# Altium footprint library Molex FFC - FPC Connectors (SMT).PcbLib: 638 footprints (part 12 of 40)
Each footprint in its own frame and in the unit in brackets; x right, y up, seen from the top. Pads: shape width x height; smd on the part's side, far side on the other; paste and mask are expansions set on the pad; w line width, h text height; cw(c..) or ccw(c..) is an arc to the next point about the centre after c.
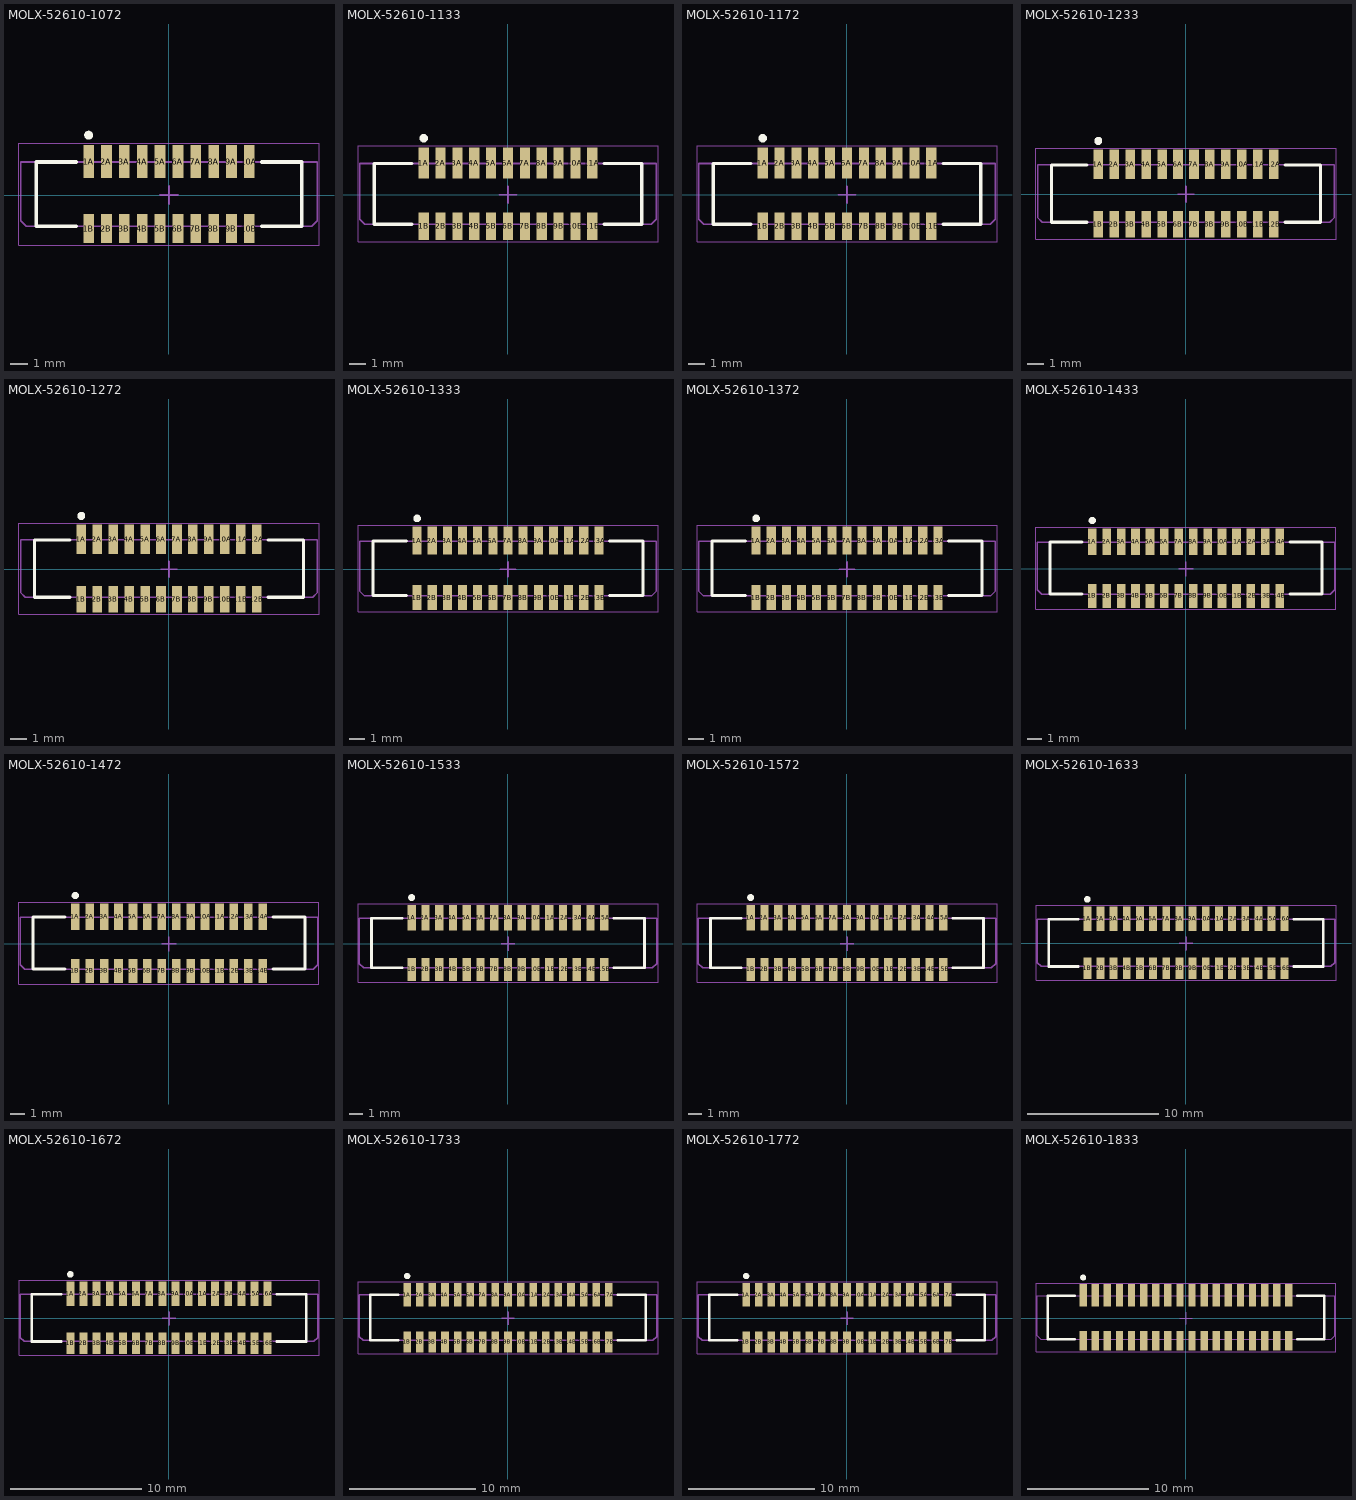
[diagram p11: the footprints below, top view; thin cyan lines are the x and y axes]

## MOLX-52610-1072 [mm] "FPC Connector, 10-Leads, Vertical, Pitch 1.0 mm, Mated Height 5.75 mm, SMT"
height 5.762
pads (20):
  rect 0.6x1.85 smd: 1A(-4.5,1.875) 2A(-3.5,1.875) 3A(-2.5,1.875) 4A(-1.5,1.875) 5A(-0.5,1.875) 6A(0.5,1.875) 7A(1.5,1.875) 8A(2.5,1.875) 9A(3.5,1.875) 10A(4.5,1.875)
  rect 0.6x1.65 smd: 1B(-4.5,-1.875) 2B(-3.5,-1.875) 3B(-2.5,-1.875) 4B(-1.5,-1.875) 5B(-0.5,-1.875) 6B(0.5,-1.875) 7B(1.5,-1.875) 8B(2.5,-1.875) 9B(3.5,-1.875) 10B(4.5,-1.875)
Top Overlay:
  circle w0.25: c-4.5,3.35 r0.125
  lines w0.2: -5.2,-1.75 -7.425,-1.75 -7.425,1.85 -5.2,1.85 ; 5.2,1.85 7.425,1.85 7.425,-1.75 5.2,-1.75
Mechanical 13:
  lines w0.1: -7.425,-1.75 -7.425,1.85 ; 7.425,-1.75 7.425,1.85 ; -8.3,-1.45 -8.3,1.85 8.3,1.85 8.3,-1.45 8,-1.75 -8,-1.75 -8.3,-1.45
Mechanical 15:
  lines w0.05: -8.4,-2.8 -8.4,2.9 8.4,2.9 8.4,-2.8 -8.4,-2.8
  lines w0.1: -0.5,0 0.5,0 ; 0,-0.5 0,0.5
3D body: height 0.25, standoff 0, extent -8.3,-2.24 8.3,2.26

## MOLX-52610-1133 [mm] "FPC Connector, 11-Leads, Vertical, Pitch 1.0 mm, Mated Height 5.75 mm, SMT"
height 5.762
pads (22):
  rect 0.6x1.85 smd: 1A(-5,1.875) 2A(-4,1.875) 3A(-3,1.875) 4A(-2,1.875) 5A(-1,1.875) 6A(0,1.875) 7A(1,1.875) 8A(2,1.875) 9A(3,1.875) 10A(4,1.875) 11A(5,1.875)
  rect 0.6x1.65 smd: 1B(-5,-1.875) 2B(-4,-1.875) 3B(-3,-1.875) 4B(-2,-1.875) 5B(-1,-1.875) 6B(0,-1.875) 7B(1,-1.875) 8B(2,-1.875) 9B(3,-1.875) 10B(4,-1.875) 11B(5,-1.875)
Top Overlay:
  circle w0.25: c-5,3.35 r0.125
  lines w0.2: -5.7,-1.75 -7.925,-1.75 -7.925,1.85 -5.7,1.85 ; 5.7,-1.75 7.925,-1.75 7.925,1.85 5.7,1.85
Mechanical 13:
  lines w0.1: -7.925,-1.75 -7.925,1.85 ; 7.925,-1.75 7.925,1.85 ; -8.8,-1.45 -8.5,-1.75 8.5,-1.75 8.8,-1.45 8.8,1.85 -8.8,1.85 -8.8,-1.45
Mechanical 15:
  lines w0.05: -8.9,-2.8 8.9,-2.8 8.9,2.9 -8.9,2.9 -8.9,-2.8
  lines w0.1: -0.5,0 0.5,0 ; 0,-0.5 0,0.5
3D body: height 0.25, standoff 0, extent -8.8,-2.24 8.8,2.26

## MOLX-52610-1172 [mm] "FPC Connector, 11-Leads, Vertical, Pitch 1.0 mm, Mated Height 5.75 mm, SMT"
height 5.762
pads (22):
  rect 0.6x1.85 smd: 1A(-5,1.875) 2A(-4,1.875) 3A(-3,1.875) 4A(-2,1.875) 5A(-1,1.875) 6A(0,1.875) 7A(1,1.875) 8A(2,1.875) 9A(3,1.875) 10A(4,1.875) 11A(5,1.875)
  rect 0.6x1.65 smd: 1B(-5,-1.875) 2B(-4,-1.875) 3B(-3,-1.875) 4B(-2,-1.875) 5B(-1,-1.875) 6B(0,-1.875) 7B(1,-1.875) 8B(2,-1.875) 9B(3,-1.875) 10B(4,-1.875) 11B(5,-1.875)
Top Overlay:
  circle w0.25: c-5,3.35 r0.125
  lines w0.2: -5.7,-1.75 -7.925,-1.75 -7.925,1.85 -5.7,1.85 ; 5.7,-1.75 7.925,-1.75 7.925,1.85 5.7,1.85
Mechanical 13:
  lines w0.1: -7.925,-1.75 -7.925,1.85 ; 7.925,-1.75 7.925,1.85 ; -8.8,-1.45 -8.5,-1.75 8.5,-1.75 8.8,-1.45 8.8,1.85 -8.8,1.85 -8.8,-1.45
Mechanical 15:
  lines w0.05: -8.9,-2.8 8.9,-2.8 8.9,2.9 -8.9,2.9 -8.9,-2.8
  lines w0.1: -0.5,0 0.5,0 ; 0,-0.5 0,0.5
3D body: height 0.25, standoff 0, extent -8.8,-2.24 8.8,2.26

## MOLX-52610-1233 [mm] "FPC Connector, 12-Leads, Vertical, Pitch 1.0 mm, Mated Height 5.75 mm, SMT"
height 5.762
pads (24):
  rect 0.6x1.85 smd: 1A(-5.5,1.875) 2A(-4.5,1.875) 3A(-3.5,1.875) 4A(-2.5,1.875) 5A(-1.5,1.875) 6A(-0.5,1.875) 7A(0.5,1.875) 8A(1.5,1.875) 9A(2.5,1.875) 10A(3.5,1.875) 11A(4.5,1.875) 12A(5.5,1.875)
  rect 0.6x1.65 smd: 1B(-5.5,-1.875) 2B(-4.5,-1.875) 3B(-3.5,-1.875) 4B(-2.5,-1.875) 5B(-1.5,-1.875) 6B(-0.5,-1.875) 7B(0.5,-1.875) 8B(1.5,-1.875) 9B(2.5,-1.875) 10B(3.5,-1.875) 11B(4.5,-1.875) 12B(5.5,-1.875)
Top Overlay:
  circle w0.25: c-5.5,3.35 r0.125
  lines w0.2: -6.2,-1.75 -8.425,-1.75 -8.425,1.85 -6.2,1.85 ; 6.2,-1.75 8.425,-1.75 8.425,1.85 6.2,1.85
Mechanical 13:
  lines w0.1: -8.425,-1.75 -8.425,1.85 ; 8.425,-1.75 8.425,1.85 ; -9.3,-1.45 -9,-1.75 9,-1.75 9.3,-1.45 9.3,1.85 -9.3,1.85 -9.3,-1.45
Mechanical 15:
  lines w0.05: -9.4,-2.8 9.4,-2.8 9.4,2.9 -9.4,2.9 -9.4,-2.8
  lines w0.1: -0.5,0 0.5,0 ; 0,-0.5 0,0.5
3D body: height 0.25, standoff 0, extent -9.3,-2.24 9.3,2.26

## MOLX-52610-1272 [mm] "FPC Connector, 12-Leads, Vertical, Pitch 1.0 mm, Mated Height 5.75 mm, SMT"
height 5.762
pads (24):
  rect 0.6x1.85 smd: 1A(-5.5,1.875) 2A(-4.5,1.875) 3A(-3.5,1.875) 4A(-2.5,1.875) 5A(-1.5,1.875) 6A(-0.5,1.875) 7A(0.5,1.875) 8A(1.5,1.875) 9A(2.5,1.875) 10A(3.5,1.875) 11A(4.5,1.875) 12A(5.5,1.875)
  rect 0.6x1.65 smd: 1B(-5.5,-1.875) 2B(-4.5,-1.875) 3B(-3.5,-1.875) 4B(-2.5,-1.875) 5B(-1.5,-1.875) 6B(-0.5,-1.875) 7B(0.5,-1.875) 8B(1.5,-1.875) 9B(2.5,-1.875) 10B(3.5,-1.875) 11B(4.5,-1.875) 12B(5.5,-1.875)
Top Overlay:
  circle w0.25: c-5.5,3.35 r0.125
  lines w0.2: -6.2,-1.75 -8.425,-1.75 -8.425,1.85 -6.2,1.85 ; 6.2,-1.75 8.425,-1.75 8.425,1.85 6.2,1.85
Mechanical 13:
  lines w0.1: -8.425,-1.75 -8.425,1.85 ; 8.425,-1.75 8.425,1.85 ; -9.3,-1.45 -9.3,1.85 9.3,1.85 9.3,-1.45 9,-1.75 -9,-1.75 -9.3,-1.45
Mechanical 15:
  lines w0.05: -9.4,-2.8 -9.4,2.9 9.4,2.9 9.4,-2.8 -9.4,-2.8
  lines w0.1: -0.5,0 0.5,0 ; 0,-0.5 0,0.5
3D body: height 0.25, standoff 0, extent -9.3,-2.24 9.3,2.26

## MOLX-52610-1333 [mm] "FPC Connector, 13-Leads, Vertical, Pitch 1.0 mm, Mated Height 5.75 mm, SMT"
height 5.762
pads (26):
  rect 0.6x1.85 smd: 1A(-6,1.875) 2A(-5,1.875) 3A(-4,1.875) 4A(-3,1.875) 5A(-2,1.875) 6A(-1,1.875) 7A(0,1.875) 8A(1,1.875) 9A(2,1.875) 10A(3,1.875) 11A(4,1.875) 12A(5,1.875) 13A(6,1.875)
  rect 0.6x1.65 smd: 1B(-6,-1.875) 2B(-5,-1.875) 3B(-4,-1.875) 4B(-3,-1.875) 5B(-2,-1.875) 6B(-1,-1.875) 7B(0,-1.875) 8B(1,-1.875) 9B(2,-1.875) 10B(3,-1.875) 11B(4,-1.875) 12B(5,-1.875) 13B(6,-1.875)
Top Overlay:
  circle w0.25: c-6,3.35 r0.125
  lines w0.2: -6.7,-1.75 -8.925,-1.75 -8.925,1.85 -6.7,1.85 ; 6.7,-1.75 8.925,-1.75 8.925,1.85 6.7,1.85
Mechanical 13:
  lines w0.1: -8.925,-1.75 -8.925,1.85 ; 8.925,-1.75 8.925,1.85 ; -9.8,-1.45 -9.5,-1.75 9.5,-1.75 9.8,-1.45 9.8,1.85 -9.8,1.85 -9.8,-1.45
Mechanical 15:
  lines w0.05: -9.9,-2.8 9.9,-2.8 9.9,2.9 -9.9,2.9 -9.9,-2.8
  lines w0.1: -0.5,0 0.5,0 ; 0,-0.5 0,0.5
3D body: height 0.25, standoff 0, extent -9.8,-2.24 9.8,2.26

## MOLX-52610-1372 [mm] "FPC Connector, 13-Leads, Vertical, Pitch 1.0 mm, Mated Height 5.75 mm, SMT"
height 5.762
pads (26):
  rect 0.6x1.85 smd: 1A(-6,1.875) 2A(-5,1.875) 3A(-4,1.875) 4A(-3,1.875) 5A(-2,1.875) 6A(-1,1.875) 7A(0,1.875) 8A(1,1.875) 9A(2,1.875) 10A(3,1.875) 11A(4,1.875) 12A(5,1.875) 13A(6,1.875)
  rect 0.6x1.65 smd: 1B(-6,-1.875) 2B(-5,-1.875) 3B(-4,-1.875) 4B(-3,-1.875) 5B(-2,-1.875) 6B(-1,-1.875) 7B(0,-1.875) 8B(1,-1.875) 9B(2,-1.875) 10B(3,-1.875) 11B(4,-1.875) 12B(5,-1.875) 13B(6,-1.875)
Top Overlay:
  circle w0.25: c-6,3.35 r0.125
  lines w0.2: -6.7,-1.75 -8.925,-1.75 -8.925,1.85 -6.7,1.85 ; 6.7,-1.75 8.925,-1.75 8.925,1.85 6.7,1.85
Mechanical 13:
  lines w0.1: -8.925,-1.75 -8.925,1.85 ; 8.925,-1.75 8.925,1.85 ; -9.8,-1.45 -9.5,-1.75 9.5,-1.75 9.8,-1.45 9.8,1.85 -9.8,1.85 -9.8,-1.45
Mechanical 15:
  lines w0.05: -9.9,-2.8 9.9,-2.8 9.9,2.9 -9.9,2.9 -9.9,-2.8
  lines w0.1: -0.5,0 0.5,0 ; 0,-0.5 0,0.5
3D body: height 0.25, standoff 0, extent -9.8,-2.24 9.8,2.26

## MOLX-52610-1433 [mm] "FPC Connector, 14-Leads, Vertical, Pitch 1.0 mm, Mated Height 5.75 mm, SMT"
height 5.762
pads (28):
  rect 0.6x1.85 smd: 1A(-6.5,1.875) 2A(-5.5,1.875) 3A(-4.5,1.875) 4A(-3.5,1.875) 5A(-2.5,1.875) 6A(-1.5,1.875) 7A(-0.5,1.875) 8A(0.5,1.875) 9A(1.5,1.875) 10A(2.5,1.875) 11A(3.5,1.875) 12A(4.5,1.875) 13A(5.5,1.875) 14A(6.5,1.875)
  rect 0.6x1.65 smd: 1B(-6.5,-1.875) 2B(-5.5,-1.875) 3B(-4.5,-1.875) 4B(-3.5,-1.875) 5B(-2.5,-1.875) 6B(-1.5,-1.875) 7B(-0.5,-1.875) 8B(0.5,-1.875) 9B(1.5,-1.875) 10B(2.5,-1.875) 11B(3.5,-1.875) 12B(4.5,-1.875) 13B(5.5,-1.875) 14B(6.5,-1.875)
Top Overlay:
  circle w0.25: c-6.5,3.35 r0.125
  lines w0.2: -7.2,-1.75 -9.425,-1.75 -9.425,1.85 -7.2,1.85 ; 7.2,-1.75 9.425,-1.75 9.425,1.85 7.2,1.85
Mechanical 13:
  lines w0.1: -9.425,-1.75 -9.425,1.85 ; 9.425,-1.75 9.425,1.85 ; -10.3,-1.45 -10,-1.75 10,-1.75 10.3,-1.45 10.3,1.85 -10.3,1.85 -10.3,-1.45
Mechanical 15:
  lines w0.05: -10.4,-2.8 10.4,-2.8 10.4,2.9 -10.4,2.9 -10.4,-2.8
  lines w0.1: -0.5,0 0.5,0 ; 0,-0.5 0,0.5
3D body: height 0.25, standoff 0, extent -10.3,-2.24 10.3,2.26

## MOLX-52610-1472 [mm] "FPC Connector, 14-Leads, Vertical, Pitch 1.0 mm, Mated Height 5.75 mm, SMT"
height 5.762
pads (28):
  rect 0.6x1.85 smd: 1A(-6.5,1.875) 2A(-5.5,1.875) 3A(-4.5,1.875) 4A(-3.5,1.875) 5A(-2.5,1.875) 6A(-1.5,1.875) 7A(-0.5,1.875) 8A(0.5,1.875) 9A(1.5,1.875) 10A(2.5,1.875) 11A(3.5,1.875) 12A(4.5,1.875) 13A(5.5,1.875) 14A(6.5,1.875)
  rect 0.6x1.65 smd: 1B(-6.5,-1.875) 2B(-5.5,-1.875) 3B(-4.5,-1.875) 4B(-3.5,-1.875) 5B(-2.5,-1.875) 6B(-1.5,-1.875) 7B(-0.5,-1.875) 8B(0.5,-1.875) 9B(1.5,-1.875) 10B(2.5,-1.875) 11B(3.5,-1.875) 12B(4.5,-1.875) 13B(5.5,-1.875) 14B(6.5,-1.875)
Top Overlay:
  circle w0.25: c-6.5,3.35 r0.125
  lines w0.2: -7.2,-1.75 -9.425,-1.75 -9.425,1.85 -7.2,1.85 ; 7.2,-1.75 9.425,-1.75 9.425,1.85 7.2,1.85
Mechanical 13:
  lines w0.1: -9.425,-1.75 -9.425,1.85 ; 9.425,-1.75 9.425,1.85 ; -10.3,-1.45 -10.3,1.85 10.3,1.85 10.3,-1.45 10,-1.75 -10,-1.75 -10.3,-1.45
Mechanical 15:
  lines w0.05: -10.4,-2.8 -10.4,2.9 10.4,2.9 10.4,-2.8 -10.4,-2.8
  lines w0.1: -0.5,0 0.5,0 ; 0,-0.5 0,0.5
3D body: height 0.25, standoff 0, extent -10.3,-2.24 10.3,2.26

## MOLX-52610-1533 [mm] "FPC Connector, 15-Leads, Vertical, Pitch 1.0 mm, Mated Height 5.75 mm, SMT"
height 5.762
pads (30):
  rect 0.6x1.85 smd: 1A(-7,1.875) 2A(-6,1.875) 3A(-5,1.875) 4A(-4,1.875) 5A(-3,1.875) 6A(-2,1.875) 7A(-1,1.875) 8A(0,1.875) 9A(1,1.875) 10A(2,1.875) 11A(3,1.875) 12A(4,1.875) 13A(5,1.875) 14A(6,1.875) 15A(7,1.875)
  rect 0.6x1.65 smd: 1B(-7,-1.875) 2B(-6,-1.875) 3B(-5,-1.875) 4B(-4,-1.875) 5B(-3,-1.875) 6B(-2,-1.875) 7B(-1,-1.875) 8B(0,-1.875) 9B(1,-1.875) 10B(2,-1.875) 11B(3,-1.875) 12B(4,-1.875) 13B(5,-1.875) 14B(6,-1.875) 15B(7,-1.875)
Top Overlay:
  circle w0.25: c-7,3.35 r0.125
  lines w0.2: -7.7,-1.75 -9.925,-1.75 -9.925,1.85 -7.7,1.85 ; 7.7,-1.75 9.925,-1.75 9.925,1.85 7.7,1.85
Mechanical 13:
  lines w0.1: -9.925,-1.75 -9.925,1.85 ; 9.925,-1.75 9.925,1.85 ; -10.8,-1.45 -10.5,-1.75 10.5,-1.75 10.8,-1.45 10.8,1.85 -10.8,1.85 -10.8,-1.45
Mechanical 15:
  lines w0.05: -10.9,-2.8 10.9,-2.8 10.9,2.9 -10.9,2.9 -10.9,-2.8
  lines w0.1: -0.5,0 0.5,0 ; 0,-0.5 0,0.5
3D body: height 0.25, standoff 0, extent -10.8,-2.24 10.8,2.26

## MOLX-52610-1572 [mm] "FPC Connector, 15-Leads, Vertical, Pitch 1.0 mm, Mated Height 5.75 mm, SMT"
height 5.762
pads (30):
  rect 0.6x1.85 smd: 1A(-7,1.875) 2A(-6,1.875) 3A(-5,1.875) 4A(-4,1.875) 5A(-3,1.875) 6A(-2,1.875) 7A(-1,1.875) 8A(0,1.875) 9A(1,1.875) 10A(2,1.875) 11A(3,1.875) 12A(4,1.875) 13A(5,1.875) 14A(6,1.875) 15A(7,1.875)
  rect 0.6x1.65 smd: 1B(-7,-1.875) 2B(-6,-1.875) 3B(-5,-1.875) 4B(-4,-1.875) 5B(-3,-1.875) 6B(-2,-1.875) 7B(-1,-1.875) 8B(0,-1.875) 9B(1,-1.875) 10B(2,-1.875) 11B(3,-1.875) 12B(4,-1.875) 13B(5,-1.875) 14B(6,-1.875) 15B(7,-1.875)
Top Overlay:
  circle w0.25: c-7,3.35 r0.125
  lines w0.2: -7.7,-1.75 -9.925,-1.75 -9.925,1.85 -7.7,1.85 ; 7.7,-1.75 9.925,-1.75 9.925,1.85 7.7,1.85
Mechanical 13:
  lines w0.1: -9.925,-1.75 -9.925,1.85 ; 9.925,-1.75 9.925,1.85 ; -10.8,-1.45 -10.5,-1.75 10.5,-1.75 10.8,-1.45 10.8,1.85 -10.8,1.85 -10.8,-1.45
Mechanical 15:
  lines w0.05: -10.9,-2.8 10.9,-2.8 10.9,2.9 -10.9,2.9 -10.9,-2.8
  lines w0.1: -0.5,0 0.5,0 ; 0,-0.5 0,0.5
3D body: height 0.25, standoff 0, extent -10.8,-2.24 10.8,2.26

## MOLX-52610-1633 [mm] "FPC Connector, 16-Leads, Vertical, Pitch 1.0 mm, Mated Height 5.75 mm, SMT"
height 5.762
pads (32):
  rect 0.6x1.85 smd: 1A(-7.5,1.875) 2A(-6.5,1.875) 3A(-5.5,1.875) 4A(-4.5,1.875) 5A(-3.5,1.875) 6A(-2.5,1.875) 7A(-1.5,1.875) 8A(-0.5,1.875) 9A(0.5,1.875) 10A(1.5,1.875) 11A(2.5,1.875) 12A(3.5,1.875) 13A(4.5,1.875) 14A(5.5,1.875) 15A(6.5,1.875) 16A(7.5,1.875)
  rect 0.6x1.65 smd: 1B(-7.5,-1.875) 2B(-6.5,-1.875) 3B(-5.5,-1.875) 4B(-4.5,-1.875) 5B(-3.5,-1.875) 6B(-2.5,-1.875) 7B(-1.5,-1.875) 8B(-0.5,-1.875) 9B(0.5,-1.875) 10B(1.5,-1.875) 11B(2.5,-1.875) 12B(3.5,-1.875) 13B(4.5,-1.875) 14B(5.5,-1.875) 15B(6.5,-1.875) 16B(7.5,-1.875)
Top Overlay:
  circle w0.25: c-7.5,3.35 r0.125
  lines w0.2: -8.2,-1.75 -10.425,-1.75 -10.425,1.85 -8.2,1.85 ; 8.2,-1.75 10.425,-1.75 10.425,1.85 8.2,1.85
Mechanical 13:
  lines w0.1: -10.425,-1.75 -10.425,1.85 ; 10.425,-1.75 10.425,1.85 ; -11.3,-1.45 -11.3,1.85 11.3,1.85 11.3,-1.45 11,-1.75 -11,-1.75 -11.3,-1.45
Mechanical 15:
  lines w0.05: -11.4,-2.8 -11.4,2.9 11.4,2.9 11.4,-2.8 -11.4,-2.8
  lines w0.1: -0.5,0 0.5,0 ; 0,-0.5 0,0.5
3D body: height 0.25, standoff 0, extent -11.3,-2.24 11.3,2.26

## MOLX-52610-1672 [mm] "FPC Connector, 16-Leads, Vertical, Pitch 1.0 mm, Mated Height 5.75 mm, SMT"
height 5.762
pads (32):
  rect 0.6x1.85 smd: 1A(-7.5,1.875) 2A(-6.5,1.875) 3A(-5.5,1.875) 4A(-4.5,1.875) 5A(-3.5,1.875) 6A(-2.5,1.875) 7A(-1.5,1.875) 8A(-0.5,1.875) 9A(0.5,1.875) 10A(1.5,1.875) 11A(2.5,1.875) 12A(3.5,1.875) 13A(4.5,1.875) 14A(5.5,1.875) 15A(6.5,1.875) 16A(7.5,1.875)
  rect 0.6x1.65 smd: 1B(-7.5,-1.875) 2B(-6.5,-1.875) 3B(-5.5,-1.875) 4B(-4.5,-1.875) 5B(-3.5,-1.875) 6B(-2.5,-1.875) 7B(-1.5,-1.875) 8B(-0.5,-1.875) 9B(0.5,-1.875) 10B(1.5,-1.875) 11B(2.5,-1.875) 12B(3.5,-1.875) 13B(4.5,-1.875) 14B(5.5,-1.875) 15B(6.5,-1.875) 16B(7.5,-1.875)
Top Overlay:
  circle w0.25: c-7.5,3.35 r0.125
  lines w0.2: -8.2,-1.75 -10.425,-1.75 -10.425,1.85 -8.2,1.85 ; 8.2,-1.75 10.425,-1.75 10.425,1.85 8.2,1.85
Mechanical 13:
  lines w0.1: -10.425,-1.75 -10.425,1.85 ; 10.425,-1.75 10.425,1.85 ; -11.3,-1.45 -11,-1.75 11,-1.75 11.3,-1.45 11.3,1.85 -11.3,1.85 -11.3,-1.45
Mechanical 15:
  lines w0.05: -11.4,-2.8 11.4,-2.8 11.4,2.9 -11.4,2.9 -11.4,-2.8
  lines w0.1: -0.5,0 0.5,0 ; 0,-0.5 0,0.5
3D body: height 0.25, standoff 0, extent -11.3,-2.24 11.3,2.26

## MOLX-52610-1733 [mm] "FPC Connector, 17-Leads, Vertical, Pitch 1.0 mm, Mated Height 5.75 mm, SMT"
height 5.762
pads (34):
  rect 0.6x1.85 smd: 1A(-8,1.875) 2A(-7,1.875) 3A(-6,1.875) 4A(-5,1.875) 5A(-4,1.875) 6A(-3,1.875) 7A(-2,1.875) 8A(-1,1.875) 9A(0,1.875) 10A(1,1.875) 11A(2,1.875) 12A(3,1.875) 13A(4,1.875) 14A(5,1.875) 15A(6,1.875) 16A(7,1.875) 17A(8,1.875)
  rect 0.6x1.65 smd: 1B(-8,-1.875) 2B(-7,-1.875) 3B(-6,-1.875) 4B(-5,-1.875) 5B(-4,-1.875) 6B(-3,-1.875) 7B(-2,-1.875) 8B(-1,-1.875) 9B(0,-1.875) 10B(1,-1.875) 11B(2,-1.875) 12B(3,-1.875) 13B(4,-1.875) 14B(5,-1.875) 15B(6,-1.875) 16B(7,-1.875) 17B(8,-1.875)
Top Overlay:
  circle w0.25: c-8,3.35 r0.125
  lines w0.2: -8.7,-1.75 -10.925,-1.75 -10.925,1.85 -8.7,1.85 ; 8.7,-1.75 10.925,-1.75 10.925,1.85 8.7,1.85
Mechanical 13:
  lines w0.1: -10.925,-1.75 -10.925,1.85 ; 10.925,-1.75 10.925,1.85 ; -11.8,-1.45 -11.5,-1.75 11.5,-1.75 11.8,-1.45 11.8,1.85 -11.8,1.85 -11.8,-1.45
Mechanical 15:
  lines w0.05: -11.9,-2.8 11.9,-2.8 11.9,2.9 -11.9,2.9 -11.9,-2.8
  lines w0.1: -0.5,0 0.5,0 ; 0,-0.5 0,0.5
3D body: height 0.25, standoff 0, extent -11.8,-2.24 11.8,2.26

## MOLX-52610-1772 [mm] "FPC Connector, 17-Leads, Vertical, Pitch 1.0 mm, Mated Height 5.75 mm, SMT"
height 5.762
pads (34):
  rect 0.6x1.85 smd: 1A(-8,1.875) 2A(-7,1.875) 3A(-6,1.875) 4A(-5,1.875) 5A(-4,1.875) 6A(-3,1.875) 7A(-2,1.875) 8A(-1,1.875) 9A(0,1.875) 10A(1,1.875) 11A(2,1.875) 12A(3,1.875) 13A(4,1.875) 14A(5,1.875) 15A(6,1.875) 16A(7,1.875) 17A(8,1.875)
  rect 0.6x1.65 smd: 1B(-8,-1.875) 2B(-7,-1.875) 3B(-6,-1.875) 4B(-5,-1.875) 5B(-4,-1.875) 6B(-3,-1.875) 7B(-2,-1.875) 8B(-1,-1.875) 9B(0,-1.875) 10B(1,-1.875) 11B(2,-1.875) 12B(3,-1.875) 13B(4,-1.875) 14B(5,-1.875) 15B(6,-1.875) 16B(7,-1.875) 17B(8,-1.875)
Top Overlay:
  circle w0.25: c-8,3.35 r0.125
  lines w0.2: -8.7,-1.75 -10.925,-1.75 -10.925,1.85 -8.7,1.85 ; 8.7,-1.75 10.925,-1.75 10.925,1.85 8.7,1.85
Mechanical 13:
  lines w0.1: -10.925,-1.75 -10.925,1.85 ; 10.925,-1.75 10.925,1.85 ; -11.8,-1.45 -11.5,-1.75 11.5,-1.75 11.8,-1.45 11.8,1.85 -11.8,1.85 -11.8,-1.45
Mechanical 15:
  lines w0.05: -11.9,-2.8 11.9,-2.8 11.9,2.9 -11.9,2.9 -11.9,-2.8
  lines w0.1: -0.5,0 0.5,0 ; 0,-0.5 0,0.5
3D body: height 0.25, standoff 0, extent -11.8,-2.24 11.8,2.26

## MOLX-52610-1833 [mm] "FPC Connector, 18-Leads, Vertical, Pitch 1.0 mm, Mated Height 5.75 mm, SMT"
height 5.762
pads (36):
  rect 0.6x1.85 smd: 1A(-8.5,1.875) 2A(-7.5,1.875) 3A(-6.5,1.875) 4A(-5.5,1.875) 5A(-4.5,1.875) 6A(-3.5,1.875) 7A(-2.5,1.875) 8A(-1.5,1.875) 9A(-0.5,1.875) 10A(0.5,1.875) 11A(1.5,1.875) 12A(2.5,1.875) 13A(3.5,1.875) 14A(4.5,1.875) 15A(5.5,1.875) 16A(6.5,1.875) 17A(7.5,1.875) 18A(8.5,1.875)
  rect 0.6x1.65 smd: 1B(-8.5,-1.875) 2B(-7.5,-1.875) 3B(-6.5,-1.875) 4B(-5.5,-1.875) 5B(-4.5,-1.875) 6B(-3.5,-1.875) 7B(-2.5,-1.875) 8B(-1.5,-1.875) 9B(-0.5,-1.875) 10B(0.5,-1.875) 11B(1.5,-1.875) 12B(2.5,-1.875) 13B(3.5,-1.875) 14B(4.5,-1.875) 15B(5.5,-1.875) 16B(6.5,-1.875) 17B(7.5,-1.875) 18B(8.5,-1.875)
Top Overlay:
  circle w0.25: c-8.5,3.35 r0.125
  lines w0.2: -9.2,-1.75 -11.425,-1.75 -11.425,1.85 -9.2,1.85 ; 9.2,-1.75 11.425,-1.75 11.425,1.85 9.2,1.85
Mechanical 13:
  lines w0.1: -11.425,-1.75 -11.425,1.85 ; 11.425,-1.75 11.425,1.85 ; -12.3,-1.45 -12,-1.75 12,-1.75 12.3,-1.45 12.3,1.85 -12.3,1.85 -12.3,-1.45
Mechanical 15:
  lines w0.05: -12.4,-2.8 12.4,-2.8 12.4,2.9 -12.4,2.9 -12.4,-2.8
  lines w0.1: -0.5,0 0.5,0 ; 0,-0.5 0,0.5
3D body: height 0.25, standoff 0, extent -12.3,-2.24 12.3,2.26